# Altium footprint library domino-rising-cage-clamp.PcbLib: 435 footprints (part 14 of 28)
Each footprint in its own frame and in the unit in brackets; x right, y up, seen from the top. Pads: shape width x height; smd on the part's side, far side on the other; paste and mask are expansions set on the pad; w line width, h text height; cw(c..) or ccw(c..) is an arc to the next point about the centre after c.
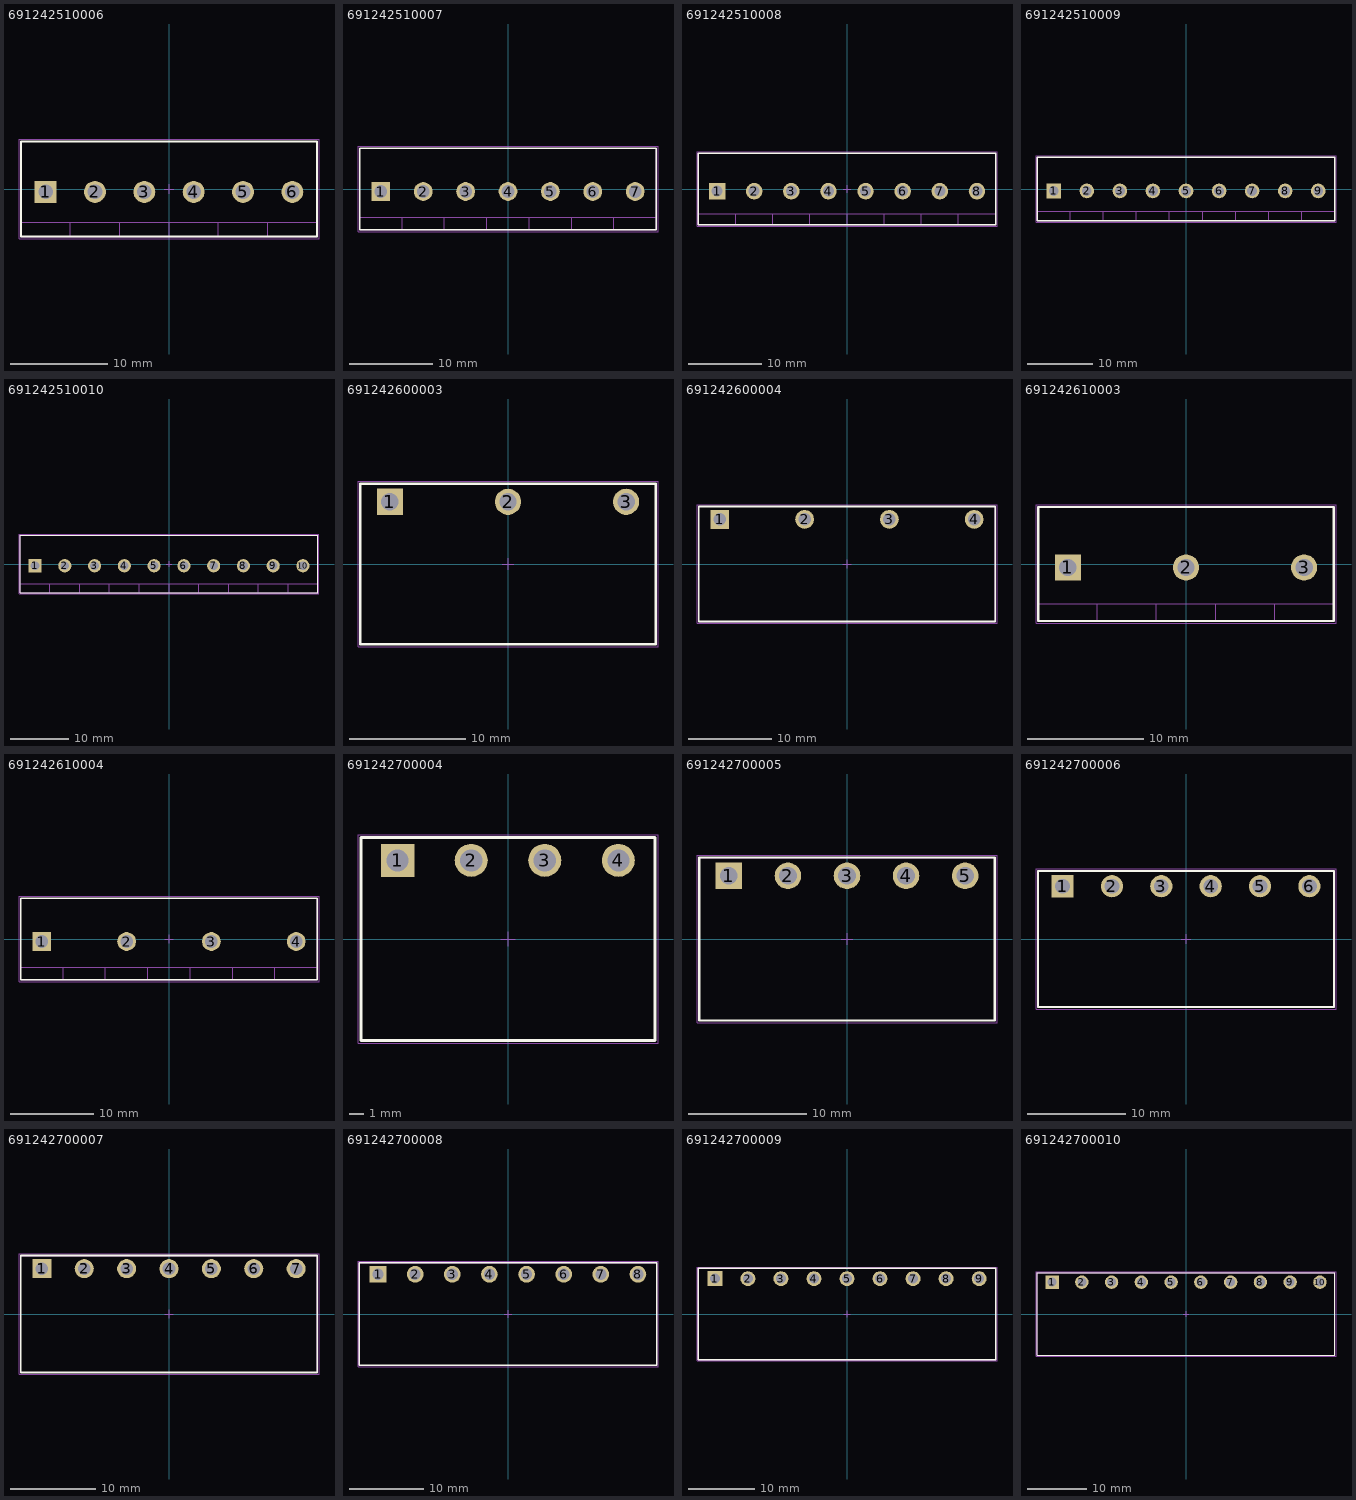
[diagram p13: the footprints below, top view; thin cyan lines are the x and y axes]

## 691242510006 [mm] "Serie 2425 - 5.08 mm _ 6 pins"
height 13.8
pads (6):
  rect 2.25x2.25 hole 1.5: 1(-12.7,-0.3)
  round 2.25 hole 1.5: 2(-7.62,-0.3) 3(-2.54,-0.3) 4(2.54,-0.3) 5(7.62,-0.3) 6(12.7,-0.3)
Top Overlay:
  lines w0.2: -15.24,-4.9 -15.24,4.9 15.24,4.9 15.24,-4.9 -15.24,-4.9
Mechanical 13:
  lines w0.1: -15.24,-3.4 15.24,-3.4 ; -10.16,-4.9 -10.16,-3.4 ; -5.08,-4.9 -5.08,-3.4 ; 0,-4.9 0,-3.4 ; 5.08,-4.9 5.08,-3.4 ; 10.16,-4.9 10.16,-3.4 ; -15.24,-4.9 15.24,-4.9 15.24,4.9 -15.24,4.9 -15.24,-4.9
Mechanical 15:
  lines w0.05: -0.5,0 0.5,0 ; 0,-0.5 0,0.5 ; -15.44,-5.1 15.44,-5.1 15.44,5.1 -15.44,5.1 -15.44,-5.1
3D body "691242510006.stp": height 13.85, standoff -3.45, extent -15.24,-4.9 15.24,4.9

## 691242510007 [mm] "Serie 2425 - 5.08 mm _ 7 pins"
height 13.8
pads (7):
  rect 2.25x2.25 hole 1.5: 1(-15.24,-0.3)
  round 2.25 hole 1.5: 2(-10.16,-0.3) 3(-5.08,-0.3) 4(0,-0.3) 5(5.08,-0.3) 6(10.16,-0.3) 7(15.24,-0.3)
Top Overlay:
  lines w0.2: -17.78,-4.9 -17.78,4.9 17.78,4.9 17.78,-4.9 -17.78,-4.9
Mechanical 13:
  lines w0.1: -17.78,-3.4 17.78,-3.4 ; -12.7,-4.9 -12.7,-3.4 ; -7.62,-4.9 -7.62,-3.4 ; -2.54,-4.9 -2.54,-3.4 ; 2.54,-4.9 2.54,-3.4 ; 7.62,-4.9 7.62,-3.4 ; 12.7,-4.9 12.7,-3.4 ; -17.78,-4.9 17.78,-4.9 17.78,4.9 -17.78,4.9 -17.78,-4.9
Mechanical 15:
  lines w0.05: -0.5,0 0.5,0 ; 0,-0.5 0,0.5 ; -17.98,-5.1 17.98,-5.1 17.98,5.1 -17.98,5.1 -17.98,-5.1
3D body "691242510007.stp": height 13.85, standoff -3.45, extent -17.78,-4.9 17.78,4.9

## 691242510008 [mm] "Serie 2425 - 5.08 mm _ 8 pins"
height 13.8
pads (8):
  rect 2.25x2.25 hole 1.5: 1(-17.78,-0.3)
  round 2.25 hole 1.5: 2(-12.7,-0.3) 3(-7.62,-0.3) 4(-2.54,-0.3) 5(2.54,-0.3) 6(7.62,-0.3) 7(12.7,-0.3) 8(17.78,-0.3)
Top Overlay:
  lines w0.2: -20.32,-4.9 -20.32,4.9 20.32,4.9 20.32,-4.9 -20.32,-4.9
Mechanical 13:
  lines w0.1: -20.32,-3.4 20.32,-3.4 ; -15.24,-4.9 -15.24,-3.4 ; -10.16,-4.9 -10.16,-3.4 ; -5.08,-4.9 -5.08,-3.4 ; 0,-4.9 0,-3.4 ; 5.08,-4.9 5.08,-3.4 ; 10.16,-4.9 10.16,-3.4 ; 15.24,-4.9 15.24,-3.4 ; -20.32,-4.9 20.32,-4.9 20.32,4.9 -20.32,4.9 -20.32,-4.9
Mechanical 15:
  lines w0.05: -0.5,0 0.5,0 ; 0,-0.5 0,0.5 ; -20.52,-5.1 20.52,-5.1 20.52,5.1 -20.52,5.1 -20.52,-5.1
3D body "691242510008.stp": height 13.85, standoff -3.45, extent -20.32,-4.9 20.32,4.9

## 691242510009 [mm] "Serie 2425 - 5.08 mm _ 9 pins"
height 13.8
pads (9):
  rect 2.25x2.25 hole 1.5: 1(-20.32,-0.3)
  round 2.25 hole 1.5: 2(-15.24,-0.3) 3(-10.16,-0.3) 4(-5.08,-0.3) 5(0,-0.3) 6(5.08,-0.3) 7(10.16,-0.3) 8(15.24,-0.3) 9(20.32,-0.3)
Top Overlay:
  lines w0.2: -22.86,-4.9 22.86,-4.9 22.86,4.9 -22.86,4.9 -22.86,-4.9
Mechanical 13:
  lines w0.1: -22.86,-3.4 22.86,-3.4 ; -17.78,-4.9 -17.78,-3.4 ; -12.7,-4.9 -12.7,-3.4 ; -7.62,-4.9 -7.62,-3.4 ; -2.54,-4.9 -2.54,-3.4 ; 2.54,-4.9 2.54,-3.4 ; 7.62,-4.9 7.62,-3.4 ; 12.7,-4.9 12.7,-3.4 ; 17.78,-4.9 17.78,-3.4 ; -22.86,-4.9 -22.86,4.9 22.86,4.9 22.86,-4.9 -22.86,-4.9
Mechanical 15:
  lines w0.05: -0.5,0 0.5,0 ; 0,-0.5 0,0.5 ; -23.06,-5.1 -23.06,5.1 23.06,5.1 23.06,-5.1 -23.06,-5.1
3D body "691242510009.stp": height 13.85, standoff -3.45, extent -22.86,-4.9 22.86,4.9

## 691242510010 [mm] "Serie 2425 - 5.08 mm _ 10 pins"
height 13.8
pads (10):
  rect 2.25x2.25 hole 1.5: 1(-22.86,-0.3)
  round 2.25 hole 1.5: 2(-17.78,-0.3) 3(-12.7,-0.3) 4(-7.62,-0.3) 5(-2.54,-0.3) 6(2.54,-0.3) 7(7.62,-0.3) 8(12.7,-0.3) 9(17.78,-0.3) 10(22.86,-0.3)
Top Overlay:
  lines w0.2: -25.4,-4.9 25.4,-4.9 25.4,4.9 -25.4,4.9 -25.4,-4.9
Mechanical 13:
  lines w0.1: -25.4,-3.4 25.4,-3.4 ; -20.32,-4.9 -20.32,-3.4 ; -15.24,-4.9 -15.24,-3.4 ; -10.16,-4.9 -10.16,-3.4 ; -5.08,-4.9 -5.08,-3.4 ; 0,-4.9 0,-3.4 ; 5.08,-4.9 5.08,-3.4 ; 10.16,-4.9 10.16,-3.4 ; 15.24,-4.9 15.24,-3.4 ; 20.32,-4.9 20.32,-3.4 ; -25.4,-4.9 -25.4,4.9 25.4,4.9 25.4,-4.9 -25.4,-4.9
Mechanical 15:
  lines w0.05: -0.5,0 0.5,0 ; 0,-0.5 0,0.5 ; -25.6,-5.1 -25.6,5.1 25.6,5.1 25.6,-5.1 -25.6,-5.1
3D body "691242510010.stp": height 13.85, standoff -3.45, extent -25.4,-4.9 25.4,4.9

## 691242600003 [mm] "Serie 2426-10.16mm Vertical Cable Entry with Rising Cage Clamp, 3 pins"
height 9
pads (3):
  rect 2.25x2.25 hole 1.5: 1(-10.16,5.35)
  round 2.25 hole 1.5: 2(0,5.35) 3(10.16,5.35)
Top Overlay:
  lines w0.2: -12.7,-6.9 12.7,-6.9 12.7,6.9 -12.7,6.9 -12.7,-6.9
Mechanical 13:
  lines w0.1: -12.7,-6.9 -12.7,6.9 12.7,6.9 12.7,-6.9 -12.7,-6.9
Mechanical 15:
  lines w0.05: -0.5,0 0.5,0 ; 0,-0.5 0,0.5 ; -12.9,-7.1 -12.9,7.1 12.9,7.1 12.9,-7.1 -12.9,-7.1
3D body "691242600003.stp": height 9.85, standoff -3.45, extent -12.7,-6.9 12.7,6.9

## 691242600004 [mm] "Serie 2426-10.16mm Vertical Cable Entry with Rising Cage Clamp, 4 pins"
height 9
pads (4):
  rect 2.25x2.25 hole 1.5: 1(-15.24,5.35)
  round 2.25 hole 1.5: 2(-5.08,5.35) 3(5.08,5.35) 4(15.24,5.35)
Top Overlay:
  lines w0.2: -17.78,-6.9 17.78,-6.9 17.78,6.9 -17.78,6.9 -17.78,-6.9
Mechanical 13:
  lines w0.1: -17.78,-6.9 -17.78,6.9 17.78,6.9 17.78,-6.9 -17.78,-6.9
Mechanical 15:
  lines w0.05: -0.5,0 0.5,0 ; 0,-0.5 0,0.5 ; -17.98,-7.1 -17.98,7.1 17.98,7.1 17.98,-7.1 -17.98,-7.1
3D body "691242600004.stp": height 9.85, standoff -3.45, extent -17.78,-6.9 17.78,6.9

## 691242610003 [mm] "Serie 2426 - 10.16 mm _ 3 pins"
height 13.8
pads (3):
  rect 2.25x2.25 hole 1.5: 1(-10.16,-0.3)
  round 2.25 hole 1.5: 2(0,-0.3) 3(10.16,-0.3)
Top Overlay:
  lines w0.2: -12.7,-4.9 12.7,-4.9 12.7,4.9 -12.7,4.9 -12.7,-4.9
Mechanical 13:
  lines w0.1: -12.7,-3.4 12.7,-3.4 ; -7.62,-4.9 -7.62,-3.4 ; -2.54,-4.9 -2.54,-3.4 ; 2.54,-4.9 2.54,-3.4 ; 7.62,-4.9 7.62,-3.4 ; -12.7,-4.9 -12.7,4.9 12.7,4.9 12.7,-4.9 -12.7,-4.9
Mechanical 15:
  lines w0.05: -0.5,0 0.5,0 ; 0,-0.5 0,0.5 ; -12.9,-5.1 12.9,-5.1 12.9,5.1 -12.9,5.1 -12.9,-5.1
3D body "691242610003.stp": height 13.9, standoff -3.4, extent -12.7,-4.9 12.7,4.9

## 691242610004 [mm] "Serie 2426 - 10.16 mm _ 4 pins"
height 13.8
pads (4):
  rect 2.25x2.25 hole 1.5: 1(-15.24,-0.3)
  round 2.25 hole 1.5: 2(-5.08,-0.3) 3(5.08,-0.3) 4(15.24,-0.3)
Top Overlay:
  lines w0.2: -17.78,-4.9 17.78,-4.9 17.78,4.9 -17.78,4.9 -17.78,-4.9
Mechanical 13:
  lines w0.1: -17.78,-3.4 17.78,-3.4 ; -12.7,-4.9 -12.7,-3.4 ; -7.62,-4.9 -7.62,-3.4 ; -2.54,-4.9 -2.54,-3.4 ; 2.54,-4.9 2.54,-3.4 ; 7.62,-4.9 7.62,-3.4 ; 12.7,-4.9 12.7,-3.4 ; -17.78,-4.9 -17.78,4.9 17.78,4.9 17.78,-4.9 -17.78,-4.9
Mechanical 15:
  lines w0.05: -0.5,0 0.5,0 ; 0,-0.5 0,0.5 ; -17.98,-5.1 17.98,-5.1 17.98,5.1 -17.98,5.1 -17.98,-5.1
3D body "691242610004.stp": height 13.9, standoff -3.4, extent -17.78,-4.9 17.78,4.9

## 691242700004 [mm] "Serie 2427-5.00mm Vertical Cable Entry with Rising Cage Clamp, 4 pins"
height 9
pads (4):
  rect 2.25x2.25 hole 1.5: 1(-7.5,5.35)
  round 2.25 hole 1.5: 2(-2.5,5.35) 3(2.5,5.35) 4(7.5,5.35)
Top Overlay:
  lines w0.2: -10,-6.9 -10,6.9 10,6.9 10,-6.9 -10,-6.9
Mechanical 13:
  lines w0.1: -10,-6.9 10,-6.9 10,6.9 -10,6.9 -10,-6.9
Mechanical 15:
  lines w0.05: -0.5,0 0.5,0 ; 0,-0.5 0,0.5 ; -10.2,-7.1 10.2,-7.1 10.2,7.1 -10.2,7.1 -10.2,-7.1
3D body "691242700004.stp": height 9.85, standoff -3.45, extent -10,-6.9 10,6.9

## 691242700005 [mm] "Serie 2427-5.00mm Vertical Cable Entry with Rising Cage Clamp, 5 pins"
height 9
pads (5):
  rect 2.25x2.25 hole 1.5: 1(-10,5.35)
  round 2.25 hole 1.5: 2(-5,5.35) 3(0,5.35) 4(5,5.35) 5(10,5.35)
Top Overlay:
  lines w0.2: -12.5,-6.9 -12.5,6.9 12.5,6.9 12.5,-6.9 -12.5,-6.9
Mechanical 13:
  lines w0.1: -12.5,-6.9 12.5,-6.9 12.5,6.9 -12.5,6.9 -12.5,-6.9
Mechanical 15:
  lines w0.05: -0.5,0 0.5,0 ; 0,-0.5 0,0.5 ; -12.7,-7.1 12.7,-7.1 12.7,7.1 -12.7,7.1 -12.7,-7.1
3D body "691242700005.stp": height 9.85, standoff -3.45, extent -12.5,-6.9 12.5,6.9

## 691242700006 [mm] "Serie 2427-5.00mm Vertical Cable Entry with Rising Cage Clamp, 6 pins"
height 9
pads (6):
  rect 2.25x2.25 hole 1.5: 1(-12.5,5.35)
  round 2.25 hole 1.5: 2(-7.5,5.35) 3(-2.5,5.35) 4(2.5,5.35) 5(7.5,5.35) 6(12.5,5.35)
Top Overlay:
  lines w0.2: -15,-6.9 -15,6.9 15,6.9 15,-6.9 -15,-6.9
Mechanical 13:
  lines w0.1: -15,-6.9 15,-6.9 15,6.9 -15,6.9 -15,-6.9
Mechanical 15:
  lines w0.05: -0.5,0 0.5,0 ; 0,-0.5 0,0.5 ; -15.2,-7.1 15.2,-7.1 15.2,7.1 -15.2,7.1 -15.2,-7.1
3D body "691242700006.stp": height 9.85, standoff -3.45, extent -15,-6.9 15,6.9

## 691242700007 [mm] "Serie 2427-5.00mm Vertical Cable Entry with Rising Cage Clamp, 7 pins"
height 9
pads (7):
  rect 2.25x2.25 hole 1.5: 1(-15,5.35)
  round 2.25 hole 1.5: 2(-10,5.35) 3(-5,5.35) 4(0,5.35) 5(5,5.35) 6(10,5.35) 7(15,5.35)
Top Overlay:
  lines w0.2: -17.5,-6.9 17.5,-6.9 17.5,6.9 -17.5,6.9 -17.5,-6.9
Mechanical 13:
  lines w0.1: -17.5,-6.9 -17.5,6.9 17.5,6.9 17.5,-6.9 -17.5,-6.9
Mechanical 15:
  lines w0.05: -0.5,0 0.5,0 ; 0,-0.5 0,0.5 ; -17.7,-7.1 -17.7,7.1 17.7,7.1 17.7,-7.1 -17.7,-7.1
3D body "691242700007.stp": height 9.85, standoff -3.45, extent -17.5,-6.9 17.5,6.9

## 691242700008 [mm] "Serie 2427-5.00mm Vertical Cable Entry with Rising Cage Clamp, 8 pins"
height 9
pads (8):
  rect 2.25x2.25 hole 1.5: 1(-17.5,5.35)
  round 2.25 hole 1.5: 2(-12.5,5.35) 3(-7.5,5.35) 4(-2.5,5.35) 5(2.5,5.35) 6(7.5,5.35) 7(12.5,5.35) 8(17.5,5.35)
Top Overlay:
  lines w0.2: -20,-6.9 -20,6.9 20,6.9 20,-6.9 -20,-6.9
Mechanical 13:
  lines w0.1: -20,-6.9 20,-6.9 20,6.9 -20,6.9 -20,-6.9
Mechanical 15:
  lines w0.05: -0.5,0 0.5,0 ; 0,-0.5 0,0.5 ; -20.2,-7.1 20.2,-7.1 20.2,7.1 -20.2,7.1 -20.2,-7.1
3D body "691242700008.stp": height 9.85, standoff -3.45, extent -20,-6.9 20,6.9

## 691242700009 [mm] "Serie 2427-5.00mm Vertical Cable Entry with Rising Cage Clamp, 9 pins"
height 9
pads (9):
  rect 2.25x2.25 hole 1.5: 1(-20,5.35)
  round 2.25 hole 1.5: 2(-15,5.35) 3(-10,5.35) 4(-5,5.35) 5(0,5.35) 6(5,5.35) 7(10,5.35) 8(15,5.35) 9(20,5.35)
Top Overlay:
  lines w0.2: -22.5,-6.9 -22.5,6.9 22.5,6.9 22.5,-6.9 -22.5,-6.9
Mechanical 13:
  lines w0.1: -22.5,-6.9 22.5,-6.9 22.5,6.9 -22.5,6.9 -22.5,-6.9
Mechanical 15:
  lines w0.05: -0.5,0 0.5,0 ; 0,-0.5 0,0.5 ; -22.7,-7.1 22.7,-7.1 22.7,7.1 -22.7,7.1 -22.7,-7.1
3D body "691242700009.stp": height 9.85, standoff -3.45, extent -22.5,-6.9 22.5,6.9

## 691242700010 [mm] "Serie 2427-5.00mm Vertical Cable Entry with Rising Cage Clamp, 10 pins"
height 9
pads (10):
  rect 2.25x2.25 hole 1.5: 1(-22.5,5.35)
  round 2.25 hole 1.5: 2(-17.5,5.35) 3(-12.5,5.35) 4(-7.5,5.35) 5(-2.5,5.35) 6(2.5,5.35) 7(7.5,5.35) 8(12.5,5.35) 9(17.5,5.35) 10(22.5,5.35)
Top Overlay:
  lines w0.2: -25,-6.9 25,-6.9 25,6.9 -25,6.9 -25,-6.9
Mechanical 13:
  lines w0.1: -25,-6.9 -25,6.9 25,6.9 25,-6.9 -25,-6.9
Mechanical 15:
  lines w0.05: -0.5,0 0.5,0 ; 0,-0.5 0,0.5 ; -25.2,-7.1 -25.2,7.1 25.2,7.1 25.2,-7.1 -25.2,-7.1
3D body "691242700010.stp": height 9.85, standoff -3.45, extent -25,-6.9 25,6.9